# Altium footprint library rcl.PCBLIB: 513 footprints (part 25 of 33)
Each footprint in its own frame and in the unit in brackets; x right, y up, seen from the top. Pads: shape width x height; smd on the part's side, far side on the other; paste and mask are expansions set on the pad; w line width, h text height; cw(c..) or ccw(c..) is an arc to the next point about the centre after c.
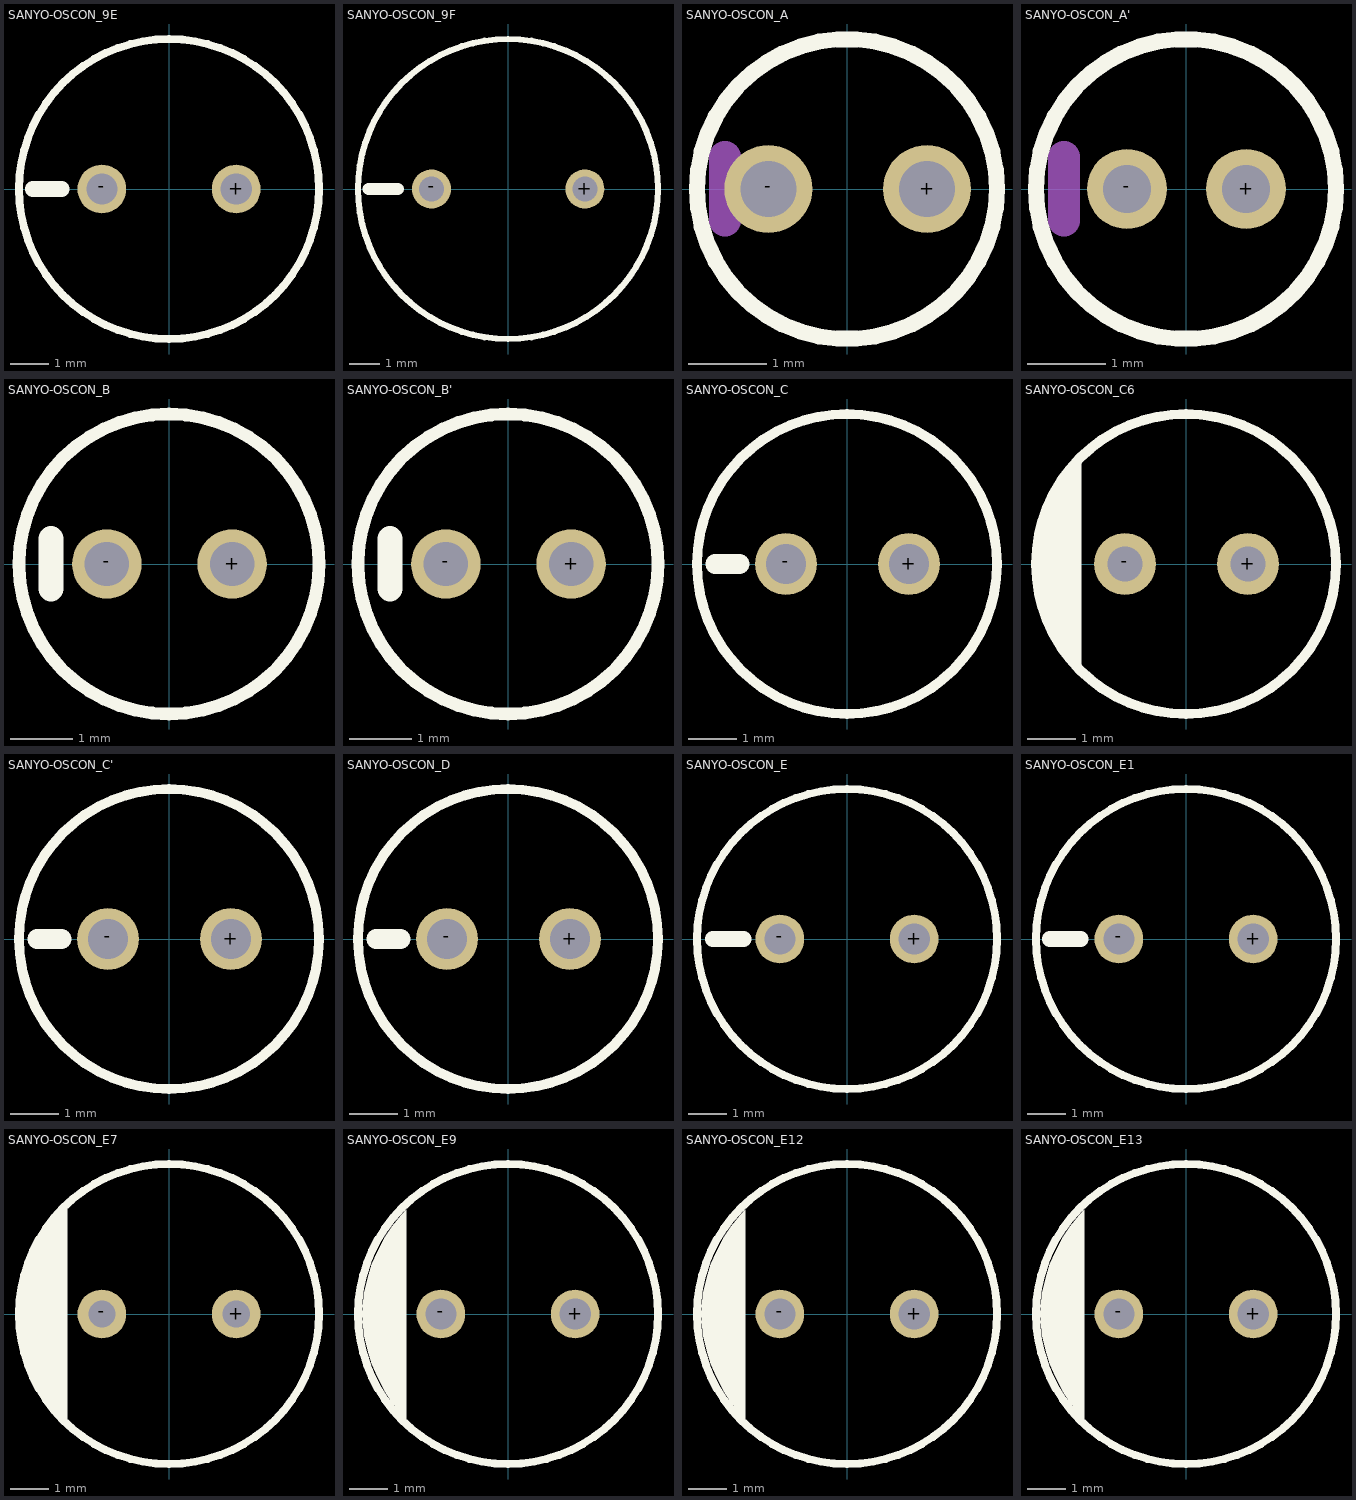
[diagram p24: the footprints below, top view; thin cyan lines are the x and y axes]

## SANYO-OSCON_9E [mil]
pads (2):
  round 50 hole 32: +(69,0) -(-68.9,0)
Top Overlay:
  circle w8: c0,0 r154
  lines w16: -139.76,0 -110.24,0

## SANYO-OSCON_9F [mil]
pads (2):
  round 50 hole 32: +(99,0) -(-98.43,0)
Top Overlay:
  circle w8: c0,0 r193
  lines w16: -179.13,0 -141.73,0

## SANYO-OSCON_A [mil]
pads (2):
  round 44 hole 28: +(40,0) -(-39.37,0)
Top Overlay:
  circle w8: c0,0 r75
Mechanical 4:
  lines w16: -61.02,-15.75 -61.02,16

## SANYO-OSCON_A' [mil]
pads (2):
  round 40 hole 24: +(30,0) -(-29.53,0)
Top Overlay:
  circle w8: c0,0 r75
Mechanical 4:
  lines w16: -61.02,-15.75 -61.02,16

## SANYO-OSCON_B [mil]
pads (2):
  round 44 hole 28: +(40,0) -(-39.37,0)
Top Overlay:
  circle w8: c0,0 r95
  lines w16: -74.8,-15.75 -74.8,16

## SANYO-OSCON_B' [mil]
pads (2):
  round 44 hole 28: +(40,0) -(-39.37,0)
Top Overlay:
  circle w8: c0,0 r95
  lines w16: -74.8,-15.75 -74.8,16

## SANYO-OSCON_C [mil]
pads (2):
  round 50 hole 32: +(50,0) -(-49.21,0)
Top Overlay:
  circle w8: c0,0 r121
  lines w16: -106.3,0 -86.61,0

## SANYO-OSCON_C6 [mil]
pads (2):
  round 50 hole 28: +(50,0) -(-49.21,0)
Top Overlay:
  circle w8: c0,0 r121
  region: -84.65,83 -84.65,-82.68 -88.59,-78.24 -95.65,-68.69 -101.83,-58.56 -107.08,-47.91 -111.36,-36.83 -114.63,-25.41 -116.87,-13.75 -118.05,-1.94 -118.11,4 -117.91,9.48 -116.51,20.36 -114.13,31.08 -110.78,41.52 -106.5,51.63 -101.32,61.3 -95.29,70.46 -88.44,79.04

## SANYO-OSCON_C' [mil]
pads (2):
  round 50 hole 32: +(50,0) -(-49.21,0)
Top Overlay:
  circle w8: c0,0 r121
  lines w16: -106.3,0 -86.61,0

## SANYO-OSCON_D [mil]
pads (2):
  round 50 hole 32: +(50,0) -(-49.21,0)
Top Overlay:
  circle w8: c0,0 r121
  lines w16: -106.3,0 -86.61,0

## SANYO-OSCON_E [mil]
pads (2):
  round 50 hole 32: +(69,0) -(-68.9,0)
Top Overlay:
  circle w8: c0,0 r154
  lines w16: -137.8,0 -106.3,0

## SANYO-OSCON_E1 [mil]
pads (2):
  round 50 hole 32: +(69,0) -(-68.9,0)
Top Overlay:
  circle w8: c0,0 r154
  lines w16: -139.76,0 -108.27,0

## SANYO-OSCON_E7 [mil]
pads (2):
  round 50 hole 28: +(69,0) -(-68.9,0)
Top Overlay:
  circle w8: c0,0 r154
  region: -104.33,111 -104.33,-110.24 -109.63,-104.7 -119.19,-92.72 -127.64,-79.93 -134.91,-66.44 -140.95,-52.35 -145.7,-37.78 -149.13,-22.84 -151.22,-7.66 -151.57,0 -151.28,7.71 -149.28,23.01 -145.91,38.06 -141.18,52.75 -135.14,66.94 -127.83,80.53 -119.32,93.4 -109.68,105.44

## SANYO-OSCON_E9 [mil]
pads (2):
  round 50 hole 32: +(69,0) -(-68.9,0)
Top Overlay:
  circle w8: c0,0 r154
  region: -104.33,107 -104.33,-108.27 -109.47,-102.8 -118.72,-91 -126.87,-78.41 -133.87,-65.15 -139.66,-51.31 -144.19,-37.01 -147.41,-22.37 -149.32,-7.49 -149.61,0 -149.33,7.42 -147.44,22.16 -144.22,36.67 -139.7,50.82 -133.91,64.5 -126.9,77.61 -118.73,90.02 -109.47,101.64

## SANYO-OSCON_E12 [mil]
pads (2):
  round 50 hole 32: +(69,0) -(-68.9,0)
Top Overlay:
  circle w8: c0,0 r154
  region: -104.33,107 -104.33,-108.27 -109.47,-102.8 -118.72,-91 -126.87,-78.41 -133.87,-65.15 -139.66,-51.31 -144.19,-37.01 -147.41,-22.37 -149.32,-7.49 -149.61,0 -149.33,7.42 -147.44,22.16 -144.22,36.67 -139.7,50.82 -133.91,64.5 -126.9,77.61 -118.73,90.02 -109.47,101.64

## SANYO-OSCON_E13 [mil]
pads (2):
  round 50 hole 32: +(69,0) -(-68.9,0)
Top Overlay:
  circle w8: c0,0 r154
  region: -104.33,107 -104.33,-108.27 -109.47,-102.8 -118.72,-91 -126.87,-78.41 -133.87,-65.15 -139.66,-51.31 -144.19,-37.01 -147.41,-22.37 -149.32,-7.49 -149.61,0 -149.33,7.42 -147.44,22.16 -144.22,36.67 -139.7,50.82 -133.91,64.5 -126.9,77.61 -118.73,90.02 -109.47,101.64